# Altium footprint library PcbLib.PcbLib: 71 footprints (part 3 of 5)
Each footprint in its own frame and in the unit in brackets; x right, y up, seen from the top. Pads: shape width x height; smd on the part's side, far side on the other; paste and mask are expansions set on the pad; w line width, h text height; cw(c..) or ccw(c..) is an arc to the next point about the centre after c.
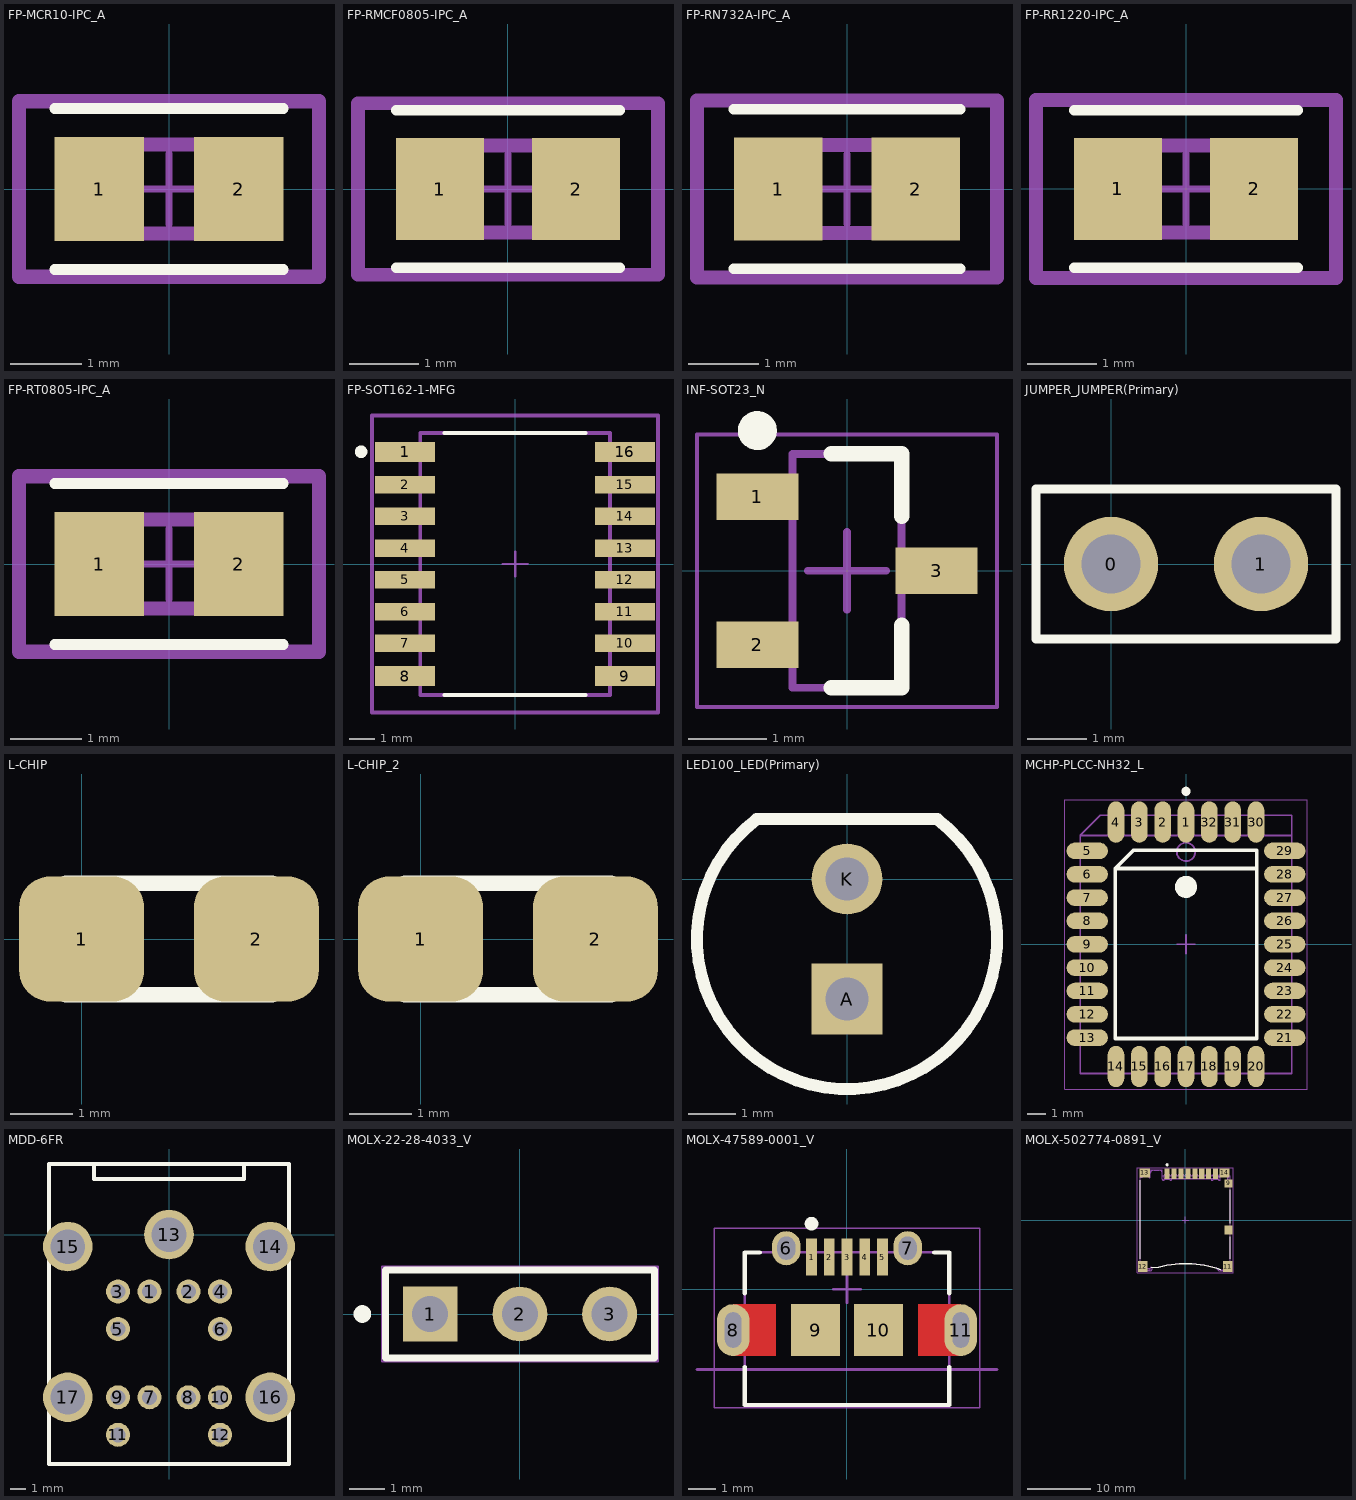
[diagram p2: the footprints below, top view; thin cyan lines are the x and y axes]

## FP-MCR10-IPC_A [mm]
pads (2):
  rect 1.258x1.462 smd paste+0 mask+0: 1(-0.977,0) 2(0.977,0)
Top Overlay:
  lines w0.15: -1.606,-1.131 1.606,-1.131 ; -1.606,1.131 1.606,1.131
Top Value:
  text ".Value" at -1.512,-0.394 h1.25
Top 3D Body:
  lines w0.2: -1,-0.625 -1,0.625 1,0.625 1,-0.625 -1,-0.625
Top Courtyard:
  lines w0.2: -2.106,-1.231 -2.106,1.231 2.106,1.231 2.106,-1.231 -2.106,-1.231
Top Assembly:
  lines w0.2: -2.106,-1.231 -2.106,1.231 2.106,1.231 2.106,-1.231 -2.106,-1.231
  text ".Value" at 0,0.011 h1
Top Component Center:
  lines w0.1: -0.5,0 0.5,0 ; 0,-0.5 0,0.5
3D body "Res_Rohm_MCR10ERTJ510_eec.STEP": height 0.25, standoff 0, extent -2.106,-1.231 2.106,1.231

## FP-RMCF0805-IPC_A [mm]
pads (2):
  rect 1.258x1.462 smd paste+0 mask+0: 1(-0.977,0) 2(0.977,0)
Top Overlay:
  lines w0.15: -1.606,-1.131 1.606,-1.131 ; -1.606,1.131 1.606,1.131
Top Value:
  text ".Value" at -1.512,-0.394 h1.25
Top 3D Body:
  lines w0.2: -1,-0.625 -1,0.625 1,0.625 1,-0.625 -1,-0.625
Top Courtyard:
  lines w0.2: -2.153,-1.231 -2.153,1.231 2.153,1.231 2.153,-1.231 -2.153,-1.231
Top Assembly:
  lines w0.2: -2.153,-1.231 -2.153,1.231 2.153,1.231 2.153,-1.231 -2.153,-1.231
  text ".Value" at 0,0.011 h1
Top Component Center:
  lines w0.1: -0.5,0 0.5,0 ; 0,-0.5 0,0.5
3D body "Res_Stackpole_Electronics_RMCF0805JT220K_eec.STEP": height 0.65, standoff 0, extent -1,-0.625 1,0.625

## FP-RN732A-IPC_A [mm]
height 5.27
pads (2):
  rect 1.258x1.462 smd paste+0 mask+0: 1(-0.977,0) 2(0.977,0)
Top Overlay:
  lines w0.15: -1.606,-1.131 1.606,-1.131 ; -1.606,1.131 1.606,1.131
Top Value:
  text ".Value" at -1.512,-0.394 h1.25
Top 3D Body:
  lines w0.2: -1,-0.625 1,-0.625 1,0.625 -1,0.625 -1,-0.625
Top Courtyard:
  lines w0.2: -2.129,-1.254 2.129,-1.254 2.129,1.254 -2.129,1.254 -2.129,-1.254
Top Assembly:
  lines w0.2: -2.129,-1.254 2.129,-1.254 2.129,1.254 -2.129,1.254 -2.129,-1.254
  text ".Value" at 0,0.011 h1
Top Component Center:
  lines w0.1: -0.5,0 0.5,0 ; 0,-0.5 0,0.5
3D body "Res_TE_Connectivity_RN73C2A2K49B_eec.STEP": height 0.25, standoff 0, extent -2.129,-1.254 2.129,1.254

## FP-RR1220-IPC_A [mm]
pads (2):
  rect 1.258x1.462 smd paste+0 mask+0: 1(-0.977,0) 2(0.977,0)
Top Overlay:
  lines w0.15: -1.606,-1.131 1.606,-1.131 ; -1.606,1.131 1.606,1.131
Top Value:
  text ".Value" at -1.512,-0.394 h1.25
Top 3D Body:
  lines w0.2: -1,-0.625 1,-0.625 1,0.625 -1,0.625 -1,-0.625
Top Courtyard:
  lines w0.2: -2.153,-1.278 2.153,-1.278 2.153,1.278 -2.153,1.278 -2.153,-1.278
Top Assembly:
  lines w0.2: -2.153,-1.278 2.153,-1.278 2.153,1.278 -2.153,1.278 -2.153,-1.278
  text ".Value" at 0,0.011 h1
Top Component Center:
  lines w0.1: -0.5,0 0.5,0 ; 0,-0.5 0,0.5
3D body "Res_Susumu_RR1220P-331-D_eec.STEP": height 0.25, standoff 0, extent -2.153,-1.278 2.153,1.278

## FP-RT0805-IPC_A [mm]
pads (2):
  rect 1.258x1.462 smd paste+0 mask+0: 1(-0.977,0) 2(0.977,0)
Top Overlay:
  lines w0.15: -1.606,-1.131 1.606,-1.131 ; -1.606,1.131 1.606,1.131
Top Value:
  text ".Value" at -1.512,-0.394 h1.25
Top 3D Body:
  lines w0.2: -1,-0.625 -1,0.625 1,0.625 1,-0.625 -1,-0.625
Top Courtyard:
  lines w0.2: -2.106,-1.231 -2.106,1.231 2.106,1.231 2.106,-1.231 -2.106,-1.231
Top Assembly:
  lines w0.2: -2.106,-1.231 -2.106,1.231 2.106,1.231 2.106,-1.231 -2.106,-1.231
  text ".Value" at 0,0.011 h1
Top Component Center:
  lines w0.1: -0.5,0 0.5,0 ; 0,-0.5 0,0.5
3D body "Res_Yageo_RT0805WRB07165RL_eec.STEP": height 0.6, standoff 0, extent -0.998,-0.625 1.002,0.625

## FP-SOT162-1-MFG [mm]
height 1.5
pads (16):
  rect 2.4x0.8 smd paste+0 mask+0: 1(-4.4,4.495) 8(-4.4,-4.495) 9(4.4,-4.495) 16(4.4,4.495)
  rect 2.4x0.7 smd paste+0 mask+0: 2(-4.4,3.175) 3(-4.4,1.905) 4(-4.4,0.635) 5(-4.4,-0.635) 6(-4.4,-1.905) 7(-4.4,-3.175) 10(4.4,-3.175) 11(4.4,-1.905) 12(4.4,-0.635) 13(4.4,0.635) 14(4.4,1.905) 15(4.4,3.175)
Top Overlay:
  circle w0.25: c-6.165,4.495 r0.125
  lines w0.15: -2.825,-5.25 2.825,-5.25 ; -2.825,5.25 2.825,5.25
Top Value:
  text ".Value" at -0.473,1.814 h1.5
Top 3D Body:
  lines w0.15: -3.8,-5.25 -3.8,5.25 3.8,5.25 3.8,-5.25 -3.8,-5.25
Top Courtyard:
  lines w0.15: -5.725,-5.95 -5.725,5.95 5.725,5.95 5.725,-5.95 -5.725,-5.95
Top Assembly:
  lines w0.15: -5.725,-5.95 -5.725,5.95 5.725,5.95 5.725,-5.95 -5.725,-5.95
  text ".Designator" at 0,0.188 h1
Top Component Center:
  lines w0.1: -0.5,0 0.5,0 ; 0,-0.5 0,0.5
3D body "IC_NXP_Semiconductors_PCF8574T-3_518_eec.STEP": height 0.25, standoff 0, extent -5.725,-5.95 5.725,5.95

## INF-SOT23_N [mm] "SOT23, 3-Leads, Body 2.9x1.3 mm, Pitch 0.95 mm, IPC Medium Density"
height 1.1
pads (3):
  rect 1.05x0.6 smd: 1(-1.15,0.95) 2(-1.15,-0.95) 3(1.15,0)
Top Overlay:
  circle w0.25: c-1.15,1.8 r0.125
  lines w0.2: -0.2,-1.5 0.7,-1.5 0.7,-0.7 ; -0.2,1.5 0.7,1.5 0.7,0.7
Top Value:
  text ".Value" at -1.766,2.273 h1.25
Mechanical 13:
  lines w0.1: -0.7,-1.5 0.7,-1.5 0.7,1.5 -0.7,1.5 -0.7,-1.5
Mechanical 15:
  lines w0.05: -1.925,-1.75 1.925,-1.75 1.925,1.75 -1.925,1.75 -1.925,-1.75
  lines w0.1: -0.5,0 0.5,0 ; 0,-0.5 0,0.5
3D body "Diode_ON_Semiconductor_BAT54C_eec.STEP": height 1.2, standoff 0, extent -1.2,-1.46 1.2,1.46

## JUMPER_JUMPER(Primary) [mm]
pads (2):
  round 1.6 hole 1: 0(0,0) 1(2.54,0)
Top Overlay:
  lines w0.15: -1.27,-1.27 3.81,-1.27 3.81,1.27 -1.27,1.27 -1.27,-1.27
3D body "User Library-PLS2.STEP": height 8.54, standoff -3, extent -1.27,-1.27 3.81,1.27

## L-CHIP [mm]
pads (2):
  rrect50% 2x2 smd: 1(0,0) 2(2.794,0)
Top Overlay:
  lines w0.25: -0.254,-0.889 -0.254,0.889 3.048,0.889 3.048,-0.889 -0.254,-0.889
Top Value:
  text ".Value" at 0.012,-0.394 h1.25

## L-CHIP_2 [mm]
pads (2):
  rrect50% 2x2 smd: 1(0,0) 2(2.794,0)
Top Overlay:
  lines w0.25: -0.254,-0.889 3.048,-0.889 3.048,0.889 -0.254,0.889 -0.254,-0.889
Top Value:
  text ".Value" at -0.115,-0.394 h1.25

## LED100_LED(Primary) [mm]
pads (2):
  rect 1.5x1.5 hole 0.9: A(0,-2.54)
  round 1.5 hole 0.9: K(0,0)
Top Overlay:
  lines w0.254: -1.911,1.266 ccw(c0,-1.27) 1.911,1.266 ; -1.905,1.27 1.905,1.27

## MCHP-PLCC-NH32_L [mm] "PLCC, 32-Leads, Body 13.97x11.43mm, Pitch 1.27mm, IPC High Density"
height 3.56
pads (32):
  oval 0.9x2.25 smd: 1(0,6.65) 2(-1.27,6.65) 3(-2.54,6.65) 4(-3.81,6.65) 14(-3.81,-6.65) 15(-2.54,-6.65) 16(-1.27,-6.65) 17(0,-6.65) 18(1.27,-6.65) 19(2.54,-6.65) 20(3.81,-6.65) 30(3.81,6.65) 31(2.54,6.65) 32(1.27,6.65)
  oval 2.25x0.9 smd: 5(-5.375,5.08) 6(-5.375,3.81) 7(-5.375,2.54) 8(-5.375,1.27) 9(-5.375,0) 10(-5.375,-1.27) 11(-5.375,-2.54) 12(-5.375,-3.81) 13(-5.375,-5.08) 21(5.375,-5.08) 22(5.375,-3.81) 23(5.375,-2.54) 24(5.375,-1.27) 25(5.375,0) 26(5.375,1.27) 27(5.375,2.54) 28(5.375,3.81) 29(5.375,5.08)
Top Overlay:
  circle w0.6: c0,3.125 r0.3
  circle w0.25: c0,8.325 r0.125
  lines w0.2: 3.85,4.125 -3.85,4.125 ; -3.85,4.125 -3.85,-5.125 3.85,-5.125 3.85,5.125 -2.85,5.125 -3.85,4.125
Top Value:
  text ".Value" at -1.814,1.051 h1.5
Mechanical 13:
  circle w0.1: c0,5.025 r0.5
  lines w0.1: 5.755,5.925 -5.755,5.925 ; -5.755,5.925 -4.655,7.025 5.755,7.025 5.755,-7.025 -5.755,-7.025 -5.755,5.925
Mechanical 15:
  lines w0.05: -6.6,-7.875 6.6,-7.875 6.6,7.875 -6.6,7.875 -6.6,-7.875
  lines w0.1: -0.5,0 0.5,0 ; 0,-0.5 0,0.5
3D body "User Library-PLCC32.STEP": height 2.89, standoff -0.4, extent -6.25,-7.453 6.25,7.453

## MDD-6FR [mm]
pads (17):
  round 1.6 hole 1: 1(-1.3,-3.8) 2(1.3,-3.8) 3(-3.4,-3.8) 4(3.4,-3.8) 5(-3.4,-6.3) 6(3.4,-6.3) 7(-1.3,-10.85) 8(1.3,-10.85) 9(-3.4,-10.85) 10(3.4,-10.85) 11(-3.4,-13.35) 12(3.4,-13.35)
  round 3.3 hole 2.3: 13(0,0) 14(6.75,-0.8) 15(-6.75,-0.8) 16(6.75,-10.85) 17(-6.75,-10.85)
Top Overlay:
  lines w0.254: -5,4.7 -5,3.7 5,3.7 5,4.7 ; -8,-15.3 -8,4.7 8,4.7 8,-15.3 -8,-15.3
3D body "1734021-4.stp": height 28.5, standoff -3.65, extent -7.211,-15.207 7.239,4.793

## MOLX-22-28-4033_V [mm] "THD, 3-Leads, Body 7.62x2.49mm, Pitch 2.54mm"
height 8.38
pads (3):
  rect 1.55x1.55 hole 1.02: 1(-2.54,0)
  round 1.55 hole 1.02: 2(0,0) 3(2.54,0)
Top Overlay:
  circle w0.25: c-4.46,0 r0.125
  lines w0.2: -3.81,-1.245 -3.81,1.245 3.81,1.245 3.81,-1.245 -3.81,-1.245
Mechanical 13:
  lines w0.1: -3.81,-1.245 -3.81,1.245 3.81,1.245 3.81,-1.245 -3.81,-1.245
Mechanical 15:
  lines w0.05: -3.91,-1.345 3.91,-1.345 3.91,1.345 -3.91,1.345 -3.91,-1.345
  lines w0.1: -0.5,0 0.5,0 ; 0,-0.5 0,0.5
3D body "022284033.stp": height 8.38, standoff -3.18, extent -3.81,-1.245 3.81,1.245

## MOLX-47589-0001_V [mm] "SMD, 5-Leads, Body 7.5x5.6mm, Pitch 0.65mm"
height 2.65
pads (11):
  rect 0.4x1.35 smd: 1(-1.3,1.175) 2(-0.65,1.175) 3(0,1.175) 4(0.65,1.175) 5(1.3,1.175)
  oval 1.05x1.25 hole 0.65 slot 0.85 at 90 deg: 6(-2.225,1.5) 7(2.225,1.5)
  oval 1.2x1.9 hole 0.6 slot 1.3 at 90 deg: 8(-4.175,-1.5) 11(4.175,-1.5)
  rect 1.8x1.9 smd: 9(-1.15,-1.5) 10(1.15,-1.5)
Top Layer:
  rectangle: 2.6,-2.45 4.175,-0.55
  region: -2.6,-0.55 -4.175,-0.55 -4.175,-2.45 -2.6,-2.45
Top Overlay:
  circle w0.25: c-1.3,2.4 r0.125
  lines w0.15: -3.75,-2.85 -3.75,-4.25 3.75,-4.25 3.75,-2.85 ; -3.75,-0.15 -3.75,1.35 -3.2,1.35 ; 3.2,1.35 3.75,1.35 3.75,-0.15
Mechanical 1:
  lines w0.1: -5.5,-2.95 5.5,-2.95
  text "PCB EDGE" at 0,0 h1
Mechanical 13:
  lines w0.1: -3.75,-4.25 3.75,-4.25 3.75,1.35 -3.75,1.35 -3.75,-4.25
Mechanical 15:
  lines w0.05: -4.875,-4.35 -4.875,2.225 4.875,2.225 4.875,-4.35 -4.875,-4.35
  lines w0.1: -0.5,0 0.5,0 ; 0,-0.5 0,0.5
3D body "475890001.stp": height 2.74, standoff -0.57, extent -4.325,-4.25 4.325,1.644

## MOLX-502774-0891_V [mm] "SMD, 14-Leads, Body 15x14.3mm, Pitch 1.1mm"
height 1.95
pads (14):
  rect 0.8x1.68 smd: 1(-2.9,7.385) 2(-1.8,7.385) 3(-0.7,7.385) 4(0.4,7.385) 5(1.5,7.385) 6(2.6,7.385) 7(3.7,7.385) 8(4.8,7.385)
  rect 1.29x1.3 smd: 9(6.855,5.825)
  rect 1.29x1.4 smd: 10(6.855,-1.575)
  rect 1.5x1.7 smd: 11(6.75,-7.375) 12(-6.75,-7.375)
  rect 1.7x1.5 smd: 13(-6.45,7.475)
  rect 1.6x1.5 smd: 14(6.21,7.475)
Top Overlay:
  circle w0.25: c-2.9,8.775 r0.125
  lines w0.15: -7.15,-6.125 -7.15,6.325 ; -5.41,-7.5 -4.227,-7.5 ; 7.15,-6.125 7.15,-2.675 ; 7.15,-0.475 7.15,4.775
  lines w0.2: -4.227,-7.5 cw(c0.1,-22.801) 5.598,-7.881
Mechanical 13:
  drawing of 232 lines, arcs and shapes, not listed
Mechanical 15:
  lines w0.05: -7.6,-8.325 -7.6,8.325 7.6,8.325 7.6,-8.325 -7.6,-8.325
  lines w0.1: -0.5,0 0.5,0 ; 0,-0.5 0,0.5
3D body "502774-0891.stp": height 1.78, standoff -0.02, extent -7.15,-8 7.15,8